# Altium footprint library SG__PCB_HOLE_Connector.PcbLib: 174 footprints (part 6 of 11)
Each footprint in its own frame and in the unit in brackets; x right, y up, seen from the top. Pads: shape width x height; smd on the part's side, far side on the other; paste and mask are expansions set on the pad; w line width, h text height; cw(c..) or ccw(c..) is an arc to the next point about the centre after c.
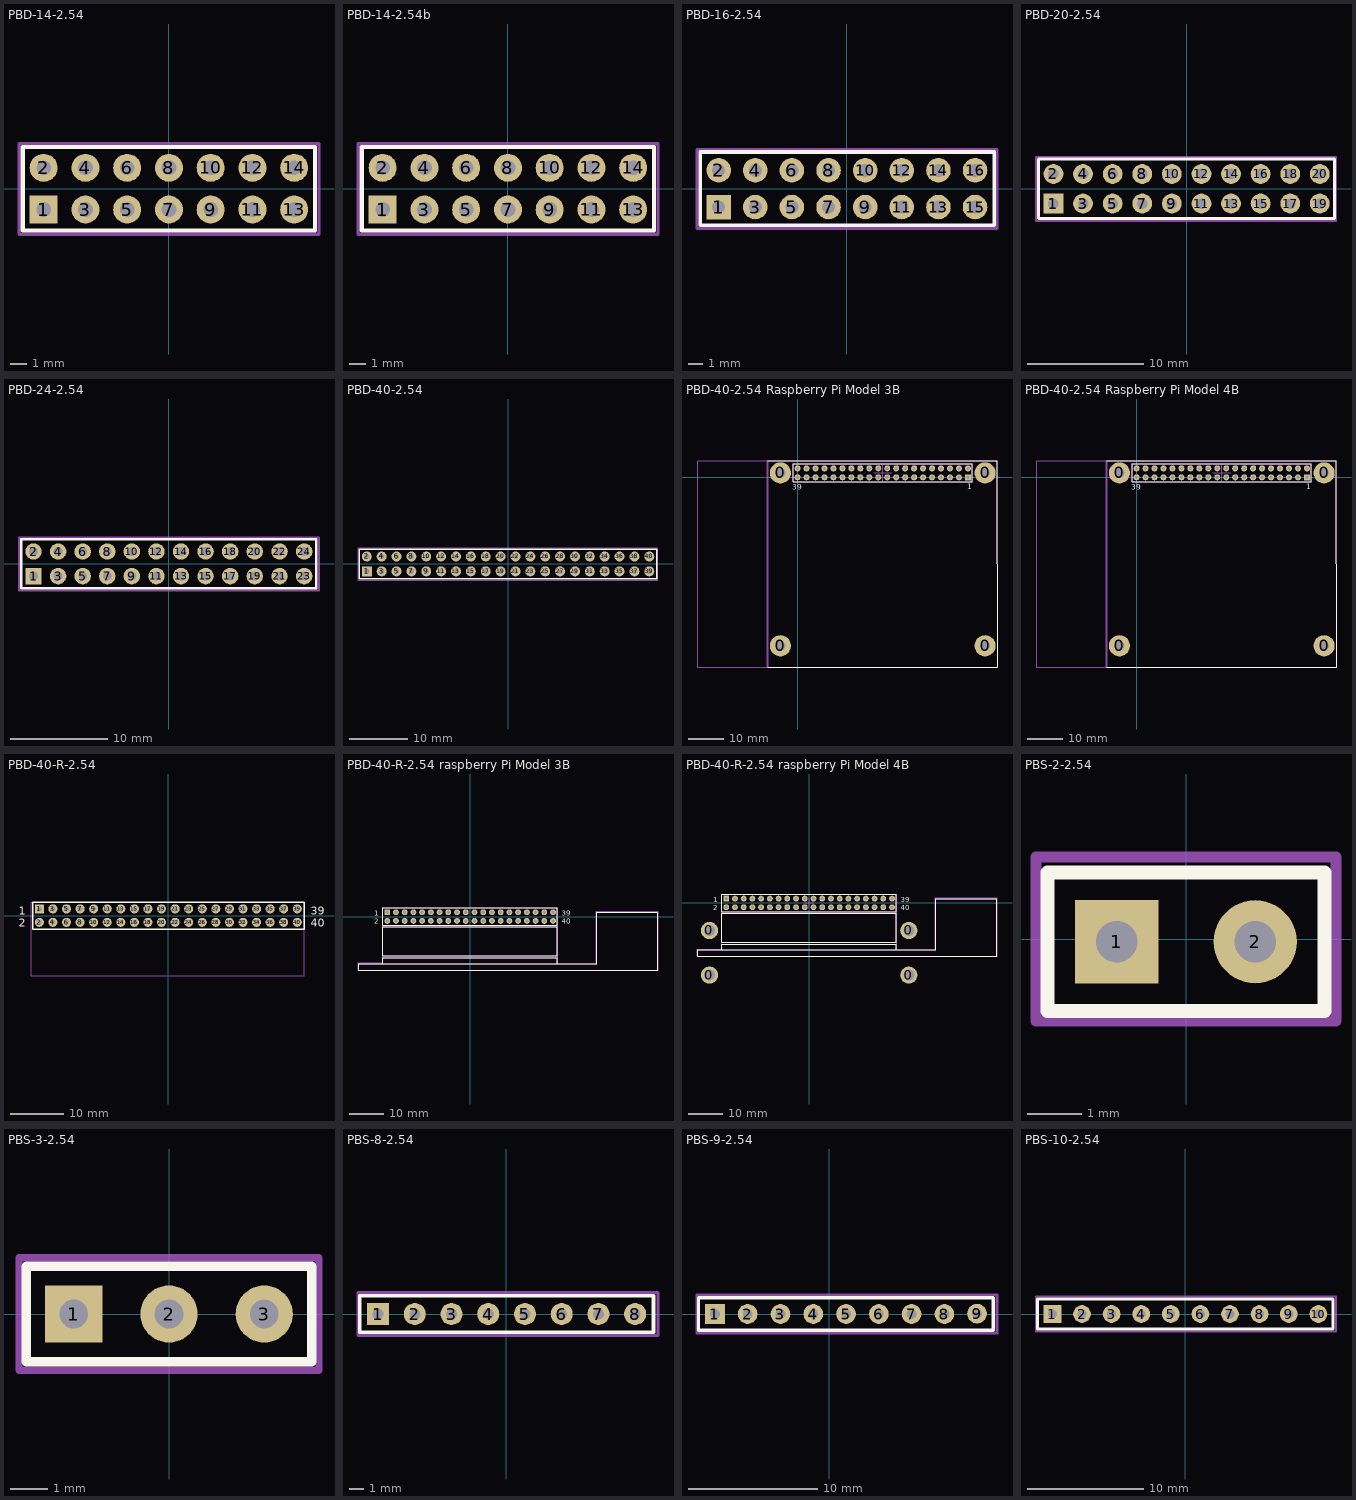
[diagram p5: the footprints below, top view; thin cyan lines are the x and y axes]

## PBD-14-2.54 [mm]
pads (14):
  rect 1.7x1.7 hole 0.9: 1(-7.62,-1.27)
  round 1.7 hole 0.9: 2(-7.62,1.27) 3(-5.08,-1.27) 4(-5.08,1.27) 5(-2.54,-1.27) 6(-2.54,1.27) 7(0,-1.27) 8(0,1.27) 9(2.54,-1.27) 10(2.54,1.27) 11(5.08,-1.27) 12(5.08,1.27) 13(7.62,-1.27) 14(7.62,1.27)
Top Overlay:
  lines w0.254: -8.89,-2.54 -8.89,2.54 8.89,2.54 8.89,-2.54 -8.89,-2.54
Top Courtyard:
  lines w0.2: -9.12,-2.77 -9.12,2.73 9.13,2.73 9.13,-2.77 -9.12,-2.77
3D body "PBS1-2.54.stp": height 9, standoff -2.65, extent 6.35,0 8.89,2.54
3D body "PBS1-2.54.stp": height 9, standoff -2.65, extent 6.35,-2.54 8.89,0
3D body "PBS1-2.54.stp": height 9, standoff -2.65, extent 1.27,0 3.81,2.54
3D body "PBS1-2.54.stp": height 9, standoff -2.65, extent 1.27,-2.54 3.81,0
3D body "PBS1-2.54.stp": height 9, standoff -2.65, extent 3.81,-2.54 6.35,0
3D body "PBS1-2.54.stp": height 9, standoff -2.65, extent 3.81,0 6.35,2.54
3D body "PBS1-2.54.stp": height 9, standoff -2.65, extent -3.81,0 -1.27,2.54
3D body "PBS1-2.54.stp": height 9, standoff -2.65, extent -3.81,-2.54 -1.27,0
3D body "PBS1-2.54.stp": height 9, standoff -2.65, extent -1.27,-2.54 1.27,0
3D body "PBS1-2.54.stp": height 9, standoff -2.65, extent -1.27,0 1.27,2.54
3D body "PBS1-2.54.stp": height 9, standoff -2.65, extent -6.35,0 -3.81,2.54
3D body "PBS1-2.54.stp": height 9, standoff -2.65, extent -6.35,-2.54 -3.81,0
3D body "PBS1-2.54.stp": height 9, standoff -2.65, extent -8.89,-2.54 -6.35,0
3D body "PBS1-2.54.stp": height 9, standoff -2.65, extent -8.89,0 -6.35,2.54

## PBD-14-2.54b [mm]
pads (14):
  rect 1.7x1.7 hole 0.9: 1(-7.62,-1.27)
  round 1.7 hole 0.9: 2(-7.62,1.27) 3(-5.08,-1.27) 4(-5.08,1.27) 5(-2.54,-1.27) 6(-2.54,1.27) 7(0,-1.27) 8(0,1.27) 9(2.54,-1.27) 10(2.54,1.27) 11(5.08,-1.27) 12(5.08,1.27) 13(7.62,-1.27) 14(7.62,1.27)
Top Overlay:
  lines w0.254: -8.89,-2.54 8.89,-2.54 8.89,2.54 -8.89,2.54 -8.89,-2.54
Top Courtyard:
  lines w0.2: -9.12,-2.77 -9.12,2.73 9.13,2.73 9.13,-2.77 -9.12,-2.77
3D body "PBS1-2.54.stp": height 2.65, standoff -9, extent -8.89,0 -6.35,2.54
3D body "PBS1-2.54.stp": height 2.65, standoff -9, extent -8.89,-2.54 -6.35,0
3D body "PBS1-2.54.stp": height 2.65, standoff -9, extent -6.35,-2.54 -3.81,0
3D body "PBS1-2.54.stp": height 2.65, standoff -9, extent -6.35,0 -3.81,2.54
3D body "PBS1-2.54.stp": height 2.65, standoff -9, extent -1.27,0 1.27,2.54
3D body "PBS1-2.54.stp": height 2.65, standoff -9, extent -1.27,-2.54 1.27,0
3D body "PBS1-2.54.stp": height 2.65, standoff -9, extent -3.81,-2.54 -1.27,0
3D body "PBS1-2.54.stp": height 2.65, standoff -9, extent -3.81,0 -1.27,2.54
3D body "PBS1-2.54.stp": height 2.65, standoff -9, extent 3.81,0 6.35,2.54
3D body "PBS1-2.54.stp": height 2.65, standoff -9, extent 3.81,-2.54 6.35,0
3D body "PBS1-2.54.stp": height 2.65, standoff -9, extent 1.27,-2.54 3.81,0
3D body "PBS1-2.54.stp": height 2.65, standoff -9, extent 1.27,0 3.81,2.54
3D body "PBS1-2.54.stp": height 2.65, standoff -9, extent 6.35,-2.54 8.89,0
3D body "PBS1-2.54.stp": height 2.65, standoff -9, extent 6.35,0 8.89,2.54

## PBD-16-2.54 [mm]
pads (16):
  rect 1.7x1.7 hole 0.9: 1(-8.89,-1.27)
  round 1.7 hole 0.9: 2(-8.89,1.27) 3(-6.35,-1.27) 4(-6.35,1.27) 5(-3.81,-1.27) 6(-3.81,1.27) 7(-1.27,-1.27) 8(-1.27,1.27) 9(1.27,-1.27) 10(1.27,1.27) 11(3.81,-1.27) 12(3.81,1.27) 13(6.35,-1.27) 14(6.35,1.27) 15(8.89,-1.27) 16(8.89,1.27)
Top Overlay:
  lines w0.254: -10.16,-2.54 10.21,-2.54 10.21,2.54 -10.16,2.54 -10.16,-2.54
Top Courtyard:
  lines w0.2: -10.39,-2.77 -10.39,2.73 10.41,2.73 10.41,-2.77 -10.39,-2.77
3D body "PBS1-2.54.stp": height 9, standoff -2.65, extent -10.16,0 -7.62,2.54
3D body "PBS1-2.54.stp": height 9, standoff -2.65, extent -10.16,-2.54 -7.62,0
3D body "PBS1-2.54.stp": height 9, standoff -2.65, extent -7.62,-2.54 -5.08,0
3D body "PBS1-2.54.stp": height 9, standoff -2.65, extent -7.62,0 -5.08,2.54
3D body "PBS1-2.54.stp": height 9, standoff -2.65, extent -2.54,0 0,2.54
3D body "PBS1-2.54.stp": height 9, standoff -2.65, extent -2.54,-2.54 0,0
3D body "PBS1-2.54.stp": height 9, standoff -2.65, extent -5.08,-2.54 -2.54,0
3D body "PBS1-2.54.stp": height 9, standoff -2.65, extent -5.08,0 -2.54,2.54
3D body "PBS1-2.54.stp": height 9, standoff -2.65, extent 2.54,0 5.08,2.54
3D body "PBS1-2.54.stp": height 9, standoff -2.65, extent 2.54,-2.54 5.08,0
3D body "PBS1-2.54.stp": height 9, standoff -2.65, extent 0,-2.54 2.54,0
3D body "PBS1-2.54.stp": height 9, standoff -2.65, extent 0,0 2.54,2.54
3D body "PBS1-2.54.stp": height 9, standoff -2.65, extent 7.62,0 10.16,2.54
3D body "PBS1-2.54.stp": height 9, standoff -2.65, extent 7.62,-2.54 10.16,0
3D body "PBS1-2.54.stp": height 9, standoff -2.65, extent 5.08,-2.54 7.62,0
3D body "PBS1-2.54.stp": height 9, standoff -2.65, extent 5.08,0 7.62,2.54

## PBD-20-2.54 [mm]
pads (20):
  rect 1.7x1.7 hole 0.9: 1(-11.43,-1.27)
  round 1.7 hole 0.9: 2(-11.43,1.27) 3(-8.89,-1.27) 4(-8.89,1.27) 5(-6.35,-1.27) 6(-6.35,1.27) 7(-3.81,-1.27) 8(-3.81,1.27) 9(-1.27,-1.27) 10(-1.27,1.27) 11(1.27,-1.27) 12(1.27,1.27) 13(3.81,-1.27) 14(3.81,1.27) 15(6.35,-1.27) 16(6.35,1.27) 17(8.89,-1.27) 18(8.89,1.27) 19(11.43,-1.27) 20(11.43,1.27)
Top Overlay:
  lines w0.254: -12.7,-2.54 12.7,-2.54 12.7,2.54 -12.7,2.54 -12.7,-2.54
Top Courtyard:
  lines w0.2: -12.93,-2.77 -12.93,2.73 12.82,2.73 12.82,-2.77 -12.93,-2.77
3D body "PBS1-2.54.stp": height 9, standoff -2.65, extent -12.7,0 -10.16,2.54
3D body "PBS1-2.54.stp": height 9, standoff -2.65, extent -12.7,-2.54 -10.16,0
3D body "PBS1-2.54.stp": height 9, standoff -2.65, extent -10.16,-2.54 -7.62,0
3D body "PBS1-2.54.stp": height 9, standoff -2.65, extent -10.16,0 -7.62,2.54
3D body "PBS1-2.54.stp": height 9, standoff -2.65, extent -5.08,0 -2.54,2.54
3D body "PBS1-2.54.stp": height 9, standoff -2.65, extent -5.08,-2.54 -2.54,0
3D body "PBS1-2.54.stp": height 9, standoff -2.65, extent -7.62,-2.54 -5.08,0
3D body "PBS1-2.54.stp": height 9, standoff -2.65, extent -7.62,0 -5.08,2.54
3D body "PBS1-2.54.stp": height 9, standoff -2.65, extent 0,0 2.54,2.54
3D body "PBS1-2.54.stp": height 9, standoff -2.65, extent 0,-2.54 2.54,0
3D body "PBS1-2.54.stp": height 9, standoff -2.65, extent -2.54,-2.54 0,0
3D body "PBS1-2.54.stp": height 9, standoff -2.65, extent -2.54,0 0,2.54
3D body "PBS1-2.54.stp": height 9, standoff -2.65, extent 5.08,0 7.62,2.54
3D body "PBS1-2.54.stp": height 9, standoff -2.65, extent 5.08,-2.54 7.62,0
3D body "PBS1-2.54.stp": height 9, standoff -2.65, extent 2.54,-2.54 5.08,0
3D body "PBS1-2.54.stp": height 9, standoff -2.65, extent 2.54,0 5.08,2.54
3D body "PBS1-2.54.stp": height 9, standoff -2.65, extent 10.16,0 12.7,2.54
3D body "PBS1-2.54.stp": height 9, standoff -2.65, extent 10.16,-2.54 12.7,0
3D body "PBS1-2.54.stp": height 9, standoff -2.65, extent 7.62,-2.54 10.16,0
3D body "PBS1-2.54.stp": height 9, standoff -2.65, extent 7.62,0 10.16,2.54

## PBD-24-2.54 [mm]
pads (24):
  rect 1.7x1.7 hole 0.9: 1(-13.983,-1.27)
  round 1.7 hole 0.9: 2(-13.983,1.27) 3(-11.443,-1.27) 4(-11.443,1.27) 5(-8.903,-1.27) 6(-8.903,1.27) 7(-6.363,-1.27) 8(-6.363,1.27) 9(-3.823,-1.27) 10(-3.823,1.27) 11(-1.283,-1.27) 12(-1.283,1.27) 13(1.257,-1.27) 14(1.257,1.27) 15(3.797,-1.27) 16(3.797,1.27) 17(6.337,-1.27) 18(6.337,1.27) 19(8.877,-1.27) 20(8.877,1.27) 21(11.443,-1.27) 22(11.443,1.27) 23(13.983,-1.27) 24(13.983,1.27)
Top Overlay:
  lines w0.254: -15.253,-2.54 15.253,-2.54 15.253,2.54 -15.253,2.54 -15.253,-2.54
Top Courtyard:
  lines w0.2: -15.483,-2.77 -15.483,2.73 15.517,2.73 15.517,-2.77 -15.483,-2.77
3D body "PBS1-2.54.stp": height 9, standoff -2.65, extent 5.067,-2.54 7.607,0
3D body "PBS1-2.54.stp": height 9, standoff -2.65, extent 5.067,0 7.607,2.54
3D body "PBS1-2.54.stp": height 9, standoff -2.65, extent 10.147,0 12.687,2.54
3D body "PBS1-2.54.stp": height 9, standoff -2.65, extent 10.147,-2.54 12.687,0
3D body "PBS1-2.54.stp": height 9, standoff -2.65, extent 12.687,-2.54 15.227,0
3D body "PBS1-2.54.stp": height 9, standoff -2.65, extent 12.687,0 15.227,2.54
3D body "PBS1-2.54.stp": height 9, standoff -2.65, extent -15.253,0 -12.713,2.54
3D body "PBS1-2.54.stp": height 9, standoff -2.65, extent -15.253,-2.54 -12.713,0
3D body "PBS1-2.54.stp": height 9, standoff -2.65, extent -12.713,-2.54 -10.173,0
3D body "PBS1-2.54.stp": height 9, standoff -2.65, extent -12.713,0 -10.173,2.54
3D body "PBS1-2.54.stp": height 9, standoff -2.65, extent -7.633,0 -5.093,2.54
3D body "PBS1-2.54.stp": height 9, standoff -2.65, extent -7.633,-2.54 -5.093,0
3D body "PBS1-2.54.stp": height 9, standoff -2.65, extent -10.173,-2.54 -7.633,0
3D body "PBS1-2.54.stp": height 9, standoff -2.65, extent -10.173,0 -7.633,2.54
3D body "PBS1-2.54.stp": height 9, standoff -2.65, extent -2.553,0 -0.013,2.54
3D body "PBS1-2.54.stp": height 9, standoff -2.65, extent -2.553,-2.54 -0.013,0
3D body "PBS1-2.54.stp": height 9, standoff -2.65, extent -5.093,-2.54 -2.553,0
3D body "PBS1-2.54.stp": height 9, standoff -2.65, extent -5.093,0 -2.553,2.54
3D body "PBS1-2.54.stp": height 9, standoff -2.65, extent 2.527,0 5.067,2.54
3D body "PBS1-2.54.stp": height 9, standoff -2.65, extent 2.527,-2.54 5.067,0
3D body "PBS1-2.54.stp": height 9, standoff -2.65, extent -0.013,-2.54 2.527,0
3D body "PBS1-2.54.stp": height 9, standoff -2.65, extent -0.013,0 2.527,2.54
3D body "PBS1-2.54.stp": height 9, standoff -2.65, extent 7.607,0 10.147,2.54
3D body "PBS1-2.54.stp": height 9, standoff -2.65, extent 7.607,-2.54 10.147,0

## PBD-40-2.54 [mm]
pads (40):
  rect 1.7x1.7 hole 0.9: 1(-24.13,-1.27)
  round 1.7 hole 0.9: 2(-24.13,1.27) 3(-21.59,-1.27) 4(-21.59,1.27) 5(-19.05,-1.27) 6(-19.05,1.27) 7(-16.51,-1.27) 8(-16.51,1.27) 9(-13.97,-1.27) 10(-13.97,1.27) 11(-11.43,-1.27) 12(-11.43,1.27) 13(-8.89,-1.27) 14(-8.89,1.27) 15(-6.35,-1.27) 16(-6.35,1.27) 17(-3.81,-1.27) 18(-3.81,1.27) 19(-1.27,-1.27) 20(-1.27,1.27) 21(1.27,-1.27) 22(1.27,1.27) 23(3.81,-1.27) 24(3.81,1.27) 25(6.35,-1.27) 26(6.35,1.27) 27(8.89,-1.27) 28(8.89,1.27) 29(11.43,-1.27) 30(11.43,1.27) 31(13.97,-1.27) 32(13.97,1.27) 33(16.51,-1.27) 34(16.51,1.27) 35(19.05,-1.27) 36(19.05,1.27) 37(21.59,-1.27) 38(21.59,1.27) 39(24.13,-1.27) 40(24.13,1.27)
Top Overlay:
  lines w0.254: -25.4,-2.54 -25.4,2.54 0,2.54 25.4,2.54 25.4,-2.54 0,-2.54 -25.4,-2.54
Top Courtyard:
  lines w0.2: -25.63,-2.77 25.62,-2.77 25.62,2.73 -25.63,2.73 -25.63,-2.77
3D body "PBS1-2.54.stp": height 9, standoff -2.65, extent -15.24,-2.54 -12.7,0
3D body "PBS1-2.54.stp": height 9, standoff -2.65, extent -12.7,-2.54 -10.16,0
3D body "PBS1-2.54.stp": height 9, standoff -2.65, extent -12.7,0 -10.16,2.54
3D body "PBS1-2.54.stp": height 9, standoff -2.65, extent -20.32,0 -17.78,2.54
3D body "PBS1-2.54.stp": height 9, standoff -2.65, extent -20.32,-2.54 -17.78,0
3D body "PBS1-2.54.stp": height 9, standoff -2.65, extent -17.78,-2.54 -15.24,0
3D body "PBS1-2.54.stp": height 9, standoff -2.65, extent -17.78,0 -15.24,2.54
3D body "PBS1-2.54.stp": height 9, standoff -2.65, extent -22.86,0 -20.32,2.54
3D body "PBS1-2.54.stp": height 9, standoff -2.65, extent -22.86,-2.54 -20.32,0
3D body "PBS1-2.54.stp": height 9, standoff -2.65, extent -25.4,-2.54 -22.86,0
3D body "PBS1-2.54.stp": height 9, standoff -2.65, extent -25.4,0 -22.86,2.54
3D body "PBS1-2.54.stp": height 9, standoff -2.65, extent 0,0 2.54,2.54
3D body "PBS1-2.54.stp": height 9, standoff -2.65, extent 0,-2.54 2.54,0
3D body "PBS1-2.54.stp": height 9, standoff -2.65, extent 2.54,-2.54 5.08,0
3D body "PBS1-2.54.stp": height 9, standoff -2.65, extent 2.54,0 5.08,2.54
3D body "PBS1-2.54.stp": height 9, standoff -2.65, extent 7.62,0 10.16,2.54
3D body "PBS1-2.54.stp": height 9, standoff -2.65, extent 7.62,-2.54 10.16,0
3D body "PBS1-2.54.stp": height 9, standoff -2.65, extent 5.08,-2.54 7.62,0
3D body "PBS1-2.54.stp": height 9, standoff -2.65, extent 5.08,0 7.62,2.54
3D body "PBS1-2.54.stp": height 9, standoff -2.65, extent 12.7,0 15.24,2.54
3D body "PBS1-2.54.stp": height 9, standoff -2.65, extent 12.7,-2.54 15.24,0
3D body "PBS1-2.54.stp": height 9, standoff -2.65, extent 10.16,-2.54 12.7,0
3D body "PBS1-2.54.stp": height 9, standoff -2.65, extent 10.16,0 12.7,2.54
3D body "PBS1-2.54.stp": height 9, standoff -2.65, extent 17.78,0 20.32,2.54
3D body "PBS1-2.54.stp": height 9, standoff -2.65, extent 17.78,-2.54 20.32,0
3D body "PBS1-2.54.stp": height 9, standoff -2.65, extent 15.24,-2.54 17.78,0
3D body "PBS1-2.54.stp": height 9, standoff -2.65, extent 15.24,0 17.78,2.54
3D body "PBS1-2.54.stp": height 9, standoff -2.65, extent 22.86,0 25.4,2.54
3D body "PBS1-2.54.stp": height 9, standoff -2.65, extent 22.86,-2.54 25.4,0
3D body "PBS1-2.54.stp": height 9, standoff -2.65, extent 20.32,-2.54 22.86,0
3D body "PBS1-2.54.stp": height 9, standoff -2.65, extent 20.32,0 22.86,2.54
3D body "PBS1-2.54.stp": height 9, standoff -2.65, extent -5.08,0 -2.54,2.54
3D body "PBS1-2.54.stp": height 9, standoff -2.65, extent -5.08,-2.54 -2.54,0
3D body "PBS1-2.54.stp": height 9, standoff -2.65, extent -2.54,-2.54 0,0
3D body "PBS1-2.54.stp": height 9, standoff -2.65, extent -2.54,0 0,2.54
3D body "PBS1-2.54.stp": height 9, standoff -2.65, extent -10.16,0 -7.62,2.54
3D body "PBS1-2.54.stp": height 9, standoff -2.65, extent -10.16,-2.54 -7.62,0
3D body "PBS1-2.54.stp": height 9, standoff -2.65, extent -7.62,-2.54 -5.08,0
3D body "PBS1-2.54.stp": height 9, standoff -2.65, extent -7.62,0 -5.08,2.54
3D body "PBS1-2.54.stp": height 9, standoff -2.65, extent -15.24,0 -12.7,2.54

## PBD-40-2.54 Raspberry Pi Model 3B [mm]
pads (44):
  round 6 hole 2.75: 0(-4.87,-47.73) 0(-4.87,1.27) 0(53.13,-47.73) 0(53.13,1.27)
  rect 1.7x1.7 hole 0.9: 1(48.26,0)
  round 1.7 hole 0.9: 2(48.26,2.54) 3(45.72,0) 4(45.72,2.54) 5(43.18,0) 6(43.18,2.54) 7(40.64,0) 8(40.64,2.54) 9(38.1,0) 10(38.1,2.54) 11(35.56,0) 12(35.56,2.54) 13(33.02,0) 14(33.02,2.54) 15(30.48,0) 16(30.48,2.54) 17(27.94,0) 18(27.94,2.54) 19(25.4,0) 20(25.4,2.54) 21(22.86,0) 22(22.86,2.54) 23(20.32,0) 24(20.32,2.54) 25(17.78,0) 26(17.78,2.54) 27(15.24,0) 28(15.24,2.54) 29(12.7,0) 30(12.7,2.54) 31(10.16,0) 32(10.16,2.54) 33(7.62,0) 34(7.62,2.54) 35(5.08,0) 36(5.08,2.54) 37(2.54,0) 38(2.54,2.54) 39(0,0) 40(0,2.54)
Top Overlay:
  lines w0.2: -8.5,-53.8 56.5,-53.8 56.5,4.7 -8.5,4.7
  lines w0.254: -1.27,-1.27 24.13,-1.27 49.53,-1.27 49.53,3.81 24.13,3.81 -1.27,3.81 -1.27,-1.27
  text "39" at -1.476,-3.503 h1.52
  text "1" at 48.057,-3.428 h1.52
Top Assembly:
  lines w0.2: -28.5,-53.8 56.5,-53.8 56.5,4.7 -28.5,4.7 -28.5,-53.766
  lines w0.254: -1.27,-1.27 -1.27,3.81 24.13,3.81 49.53,3.81 49.53,-1.27 24.13,-1.27 -1.27,-1.27
Dimensions:
  lines w0.2: 21.59,1.27 26.67,1.27 ; 24.13,-1.27 24.13,3.81
  lines w0.5: -8.5,-53.8 -8.5,4.7
  text "Board edge" at -9.762,-32.246 h1.52
Top Courtyard:
  lines w0.2: -28.5,-53.811 -28.5,4.689 ; -28.5,-53.8 56.5,-53.8 56.5,4.7 -28.5,4.7
3D body "raspberryPi3BSimplified_STEP.STEP": height 15, standoff -3.55, extent -30.3,-53.8 56.7,4.7
3D body "PBS1-2.54.stp": height 9, standoff -2.65, extent 8.89,1.27 11.43,3.81
3D body "PBS1-2.54.stp": height 9, standoff -2.65, extent -1.27,-1.27 1.27,1.27
3D body "PBS1-2.54.stp": height 9, standoff -2.65, extent -1.27,1.27 1.27,3.81
3D body "PBS1-2.54.stp": height 9, standoff -2.65, extent 3.81,1.27 6.35,3.81
3D body "PBS1-2.54.stp": height 9, standoff -2.65, extent 3.81,-1.27 6.35,1.27
3D body "PBS1-2.54.stp": height 9, standoff -2.65, extent 6.35,-1.27 8.89,1.27
3D body "PBS1-2.54.stp": height 9, standoff -2.65, extent 6.35,1.27 8.89,3.81
3D body "PBS1-2.54.stp": height 9, standoff -2.65, extent 1.27,1.27 3.81,3.81
3D body "PBS1-2.54.stp": height 9, standoff -2.65, extent 1.27,-1.27 3.81,1.27
3D body "PBS1-2.54.stp": height 9, standoff -2.65, extent 8.89,-1.27 11.43,1.27
3D body "PBS1-2.54.stp": height 9, standoff -2.65, extent 11.43,-1.27 13.97,1.27
3D body "PBS1-2.54.stp": height 9, standoff -2.65, extent 11.43,1.27 13.97,3.81
3D body "PBS1-2.54.stp": height 9, standoff -2.65, extent 13.97,1.27 16.51,3.81
3D body "PBS1-2.54.stp": height 9, standoff -2.65, extent 13.97,-1.27 16.51,1.27
3D body "PBS1-2.54.stp": height 9, standoff -2.65, extent 16.51,-1.27 19.05,1.27
3D body "PBS1-2.54.stp": height 9, standoff -2.65, extent 16.51,1.27 19.05,3.81
3D body "PBS1-2.54.stp": height 9, standoff -2.65, extent 19.05,1.27 21.59,3.81
3D body "PBS1-2.54.stp": height 9, standoff -2.65, extent 19.05,-1.27 21.59,1.27
3D body "PBS1-2.54.stp": height 9, standoff -2.65, extent 21.59,-1.27 24.13,1.27
3D body "PBS1-2.54.stp": height 9, standoff -2.65, extent 21.59,1.27 24.13,3.81
3D body "PBS1-2.54.stp": height 9, standoff -2.65, extent 24.13,1.27 26.67,3.81
3D body "PBS1-2.54.stp": height 9, standoff -2.65, extent 24.13,-1.27 26.67,1.27
3D body "PBS1-2.54.stp": height 9, standoff -2.65, extent 26.67,-1.27 29.21,1.27
3D body "PBS1-2.54.stp": height 9, standoff -2.65, extent 26.67,1.27 29.21,3.81
3D body "PBS1-2.54.stp": height 9, standoff -2.65, extent 29.21,1.27 31.75,3.81
3D body "PBS1-2.54.stp": height 9, standoff -2.65, extent 29.21,-1.27 31.75,1.27
3D body "PBS1-2.54.stp": height 9, standoff -2.65, extent 31.75,1.27 34.29,3.81
3D body "PBS1-2.54.stp": height 9, standoff -2.65, extent 31.75,-1.27 34.29,1.27
3D body "PBS1-2.54.stp": height 9, standoff -2.65, extent 34.29,1.27 36.83,3.81
3D body "PBS1-2.54.stp": height 9, standoff -2.65, extent 34.29,-1.27 36.83,1.27
3D body "PBS1-2.54.stp": height 9, standoff -2.65, extent 36.83,1.27 39.37,3.81
3D body "PBS1-2.54.stp": height 9, standoff -2.65, extent 36.83,-1.27 39.37,1.27
3D body "PBS1-2.54.stp": height 9, standoff -2.65, extent 39.37,1.27 41.91,3.81
3D body "PBS1-2.54.stp": height 9, standoff -2.65, extent 39.37,-1.27 41.91,1.27
3D body "PBS1-2.54.stp": height 9, standoff -2.65, extent 41.91,1.27 44.45,3.81
3D body "PBS1-2.54.stp": height 9, standoff -2.65, extent 41.91,-1.27 44.45,1.27
3D body "PBS1-2.54.stp": height 9, standoff -2.65, extent 44.45,1.27 46.99,3.81
3D body "PBS1-2.54.stp": height 9, standoff -2.65, extent 44.45,-1.27 46.99,1.27
3D body "PBS1-2.54.stp": height 9, standoff -2.65, extent 46.99,1.27 49.53,3.81
3D body "PBS1-2.54.stp": height 9, standoff -2.65, extent 46.99,-1.27 49.53,1.27

## PBD-40-2.54 Raspberry Pi Model 4B [mm]
pads (44):
  round 6 hole 2.75: 0(-4.87,-47.73) 0(-4.87,1.27) 0(53.13,-47.73) 0(53.13,1.27)
  rect 1.7x1.7 hole 0.9: 1(48.26,0)
  round 1.7 hole 0.9: 2(48.26,2.54) 3(45.72,0) 4(45.72,2.54) 5(43.18,0) 6(43.18,2.54) 7(40.64,0) 8(40.64,2.54) 9(38.1,0) 10(38.1,2.54) 11(35.56,0) 12(35.56,2.54) 13(33.02,0) 14(33.02,2.54) 15(30.48,0) 16(30.48,2.54) 17(27.94,0) 18(27.94,2.54) 19(25.4,0) 20(25.4,2.54) 21(22.86,0) 22(22.86,2.54) 23(20.32,0) 24(20.32,2.54) 25(17.78,0) 26(17.78,2.54) 27(15.24,0) 28(15.24,2.54) 29(12.7,0) 30(12.7,2.54) 31(10.16,0) 32(10.16,2.54) 33(7.62,0) 34(7.62,2.54) 35(5.08,0) 36(5.08,2.54) 37(2.54,0) 38(2.54,2.54) 39(0,0) 40(0,2.54)
Top Overlay:
  lines w0.2: -8.5,-53.8 56.5,-53.8 56.5,4.7 -8.5,4.7
  lines w0.254: -1.27,-1.27 24.13,-1.27 49.53,-1.27 49.53,3.81 24.13,3.81 -1.27,3.81 -1.27,-1.27
  text "39" at -1.476,-3.503 h1.52
  text "1" at 48.057,-3.428 h1.52
Top Assembly:
  lines w0.2: -28.5,-53.8 56.5,-53.8 56.5,4.7 -28.5,4.7 -28.5,-53.766
  lines w0.254: -1.27,-1.27 -1.27,3.81 24.13,3.81 49.53,3.81 49.53,-1.27 24.13,-1.27 -1.27,-1.27
Dimensions:
  lines w0.2: 21.59,1.27 26.67,1.27 ; 24.13,-1.27 24.13,3.81
  lines w0.5: -8.5,-53.8 -8.5,4.7
  text "Board edge" at -9.762,-32.246 h1.52
Top Courtyard:
  lines w0.2: -28.5,-53.811 -28.5,4.689 ; -28.5,-53.8 56.5,-53.8 56.5,4.7 -28.5,4.7
3D body "PBS1-2.54.stp": height 9, standoff -2.65, extent 8.89,1.27 11.43,3.81
3D body "PBS1-2.54.stp": height 9, standoff -2.65, extent -1.27,-1.27 1.27,1.27
3D body "PBS1-2.54.stp": height 9, standoff -2.65, extent -1.27,1.27 1.27,3.81
3D body "PBS1-2.54.stp": height 9, standoff -2.65, extent 3.81,1.27 6.35,3.81
3D body "PBS1-2.54.stp": height 9, standoff -2.65, extent 3.81,-1.27 6.35,1.27
3D body "PBS1-2.54.stp": height 9, standoff -2.65, extent 6.35,-1.27 8.89,1.27
3D body "PBS1-2.54.stp": height 9, standoff -2.65, extent 6.35,1.27 8.89,3.81
3D body "PBS1-2.54.stp": height 9, standoff -2.65, extent 1.27,1.27 3.81,3.81
3D body "PBS1-2.54.stp": height 9, standoff -2.65, extent 1.27,-1.27 3.81,1.27
3D body "PBS1-2.54.stp": height 9, standoff -2.65, extent 8.89,-1.27 11.43,1.27
3D body "PBS1-2.54.stp": height 9, standoff -2.65, extent 11.43,-1.27 13.97,1.27
3D body "PBS1-2.54.stp": height 9, standoff -2.65, extent 11.43,1.27 13.97,3.81
3D body "PBS1-2.54.stp": height 9, standoff -2.65, extent 13.97,1.27 16.51,3.81
3D body "PBS1-2.54.stp": height 9, standoff -2.65, extent 13.97,-1.27 16.51,1.27
3D body "PBS1-2.54.stp": height 9, standoff -2.65, extent 16.51,-1.27 19.05,1.27
3D body "PBS1-2.54.stp": height 9, standoff -2.65, extent 16.51,1.27 19.05,3.81
3D body "PBS1-2.54.stp": height 9, standoff -2.65, extent 19.05,1.27 21.59,3.81
3D body "PBS1-2.54.stp": height 9, standoff -2.65, extent 19.05,-1.27 21.59,1.27
3D body "PBS1-2.54.stp": height 9, standoff -2.65, extent 21.59,-1.27 24.13,1.27
3D body "PBS1-2.54.stp": height 9, standoff -2.65, extent 21.59,1.27 24.13,3.81
3D body "PBS1-2.54.stp": height 9, standoff -2.65, extent 24.13,1.27 26.67,3.81
3D body "PBS1-2.54.stp": height 9, standoff -2.65, extent 24.13,-1.27 26.67,1.27
3D body "PBS1-2.54.stp": height 9, standoff -2.65, extent 26.67,-1.27 29.21,1.27
3D body "PBS1-2.54.stp": height 9, standoff -2.65, extent 26.67,1.27 29.21,3.81
3D body "PBS1-2.54.stp": height 9, standoff -2.65, extent 29.21,1.27 31.75,3.81
3D body "PBS1-2.54.stp": height 9, standoff -2.65, extent 29.21,-1.27 31.75,1.27
3D body "PBS1-2.54.stp": height 9, standoff -2.65, extent 31.75,1.27 34.29,3.81
3D body "PBS1-2.54.stp": height 9, standoff -2.65, extent 31.75,-1.27 34.29,1.27
3D body "PBS1-2.54.stp": height 9, standoff -2.65, extent 34.29,1.27 36.83,3.81
3D body "PBS1-2.54.stp": height 9, standoff -2.65, extent 34.29,-1.27 36.83,1.27
3D body "PBS1-2.54.stp": height 9, standoff -2.65, extent 36.83,1.27 39.37,3.81
3D body "PBS1-2.54.stp": height 9, standoff -2.65, extent 36.83,-1.27 39.37,1.27
3D body "PBS1-2.54.stp": height 9, standoff -2.65, extent 39.37,1.27 41.91,3.81
3D body "PBS1-2.54.stp": height 9, standoff -2.65, extent 39.37,-1.27 41.91,1.27
3D body "PBS1-2.54.stp": height 9, standoff -2.65, extent 41.91,1.27 44.45,3.81
3D body "PBS1-2.54.stp": height 9, standoff -2.65, extent 41.91,-1.27 44.45,1.27
3D body "PBS1-2.54.stp": height 9, standoff -2.65, extent 44.45,1.27 46.99,3.81
3D body "PBS1-2.54.stp": height 9, standoff -2.65, extent 44.45,-1.27 46.99,1.27
3D body "PBS1-2.54.stp": height 9, standoff -2.65, extent 46.99,1.27 49.53,3.81
3D body "PBS1-2.54.stp": height 9, standoff -2.65, extent 46.99,-1.27 49.53,1.27
3D body "Raspberry Pi 4 Model B.STEP": height 15.4, standoff -4.5, extent -32.09,-53.6 56.9,4.8

## PBD-40-R-2.54 [mm]
pads (40):
  rect 1.7x1.7 hole 0.9: 1(-24.13,1.255)
  round 1.7 hole 0.9: 2(-24.13,-1.255) 3(-21.59,1.255) 4(-21.59,-1.255) 5(-19.05,1.255) 6(-19.05,-1.255) 7(-16.51,1.255) 8(-16.51,-1.255) 9(-13.97,1.255) 10(-13.97,-1.255) 11(-11.43,1.255) 12(-11.43,-1.255) 13(-8.89,1.255) 14(-8.89,-1.255) 15(-6.35,1.255) 16(-6.35,-1.255) 17(-3.81,1.255) 18(-3.81,-1.255) 19(-1.27,1.255) 20(-1.27,-1.255) 21(1.27,1.255) 22(1.27,-1.255) 23(3.81,1.255) 24(3.81,-1.255) 25(6.35,1.255) 26(6.35,-1.255) 27(8.89,1.255) 28(8.89,-1.255) 29(11.43,1.255) 30(11.43,-1.255) 31(13.97,1.255) 32(13.97,-1.255) 33(16.51,1.255) 34(16.51,-1.255) 35(19.05,1.255) 36(19.05,-1.255) 37(21.59,1.255) 38(21.59,-1.255) 39(24.13,1.255) 40(24.13,-1.255)
Top Overlay:
  lines w0.254: -25.4,-2.555 -25.4,2.525 0,2.525 25.4,2.525 25.4,-2.555 0,-2.555 -25.4,-2.555
  text "1 / 2" at -27.94,-2.105 h1.52
  text "39 / 40" at 26.67,-2.105 h1.52
Top Courtyard:
  lines w0.2: -25.507,2.525 25.4,2.525 25.4,-11.285 -25.63,-11.285 -25.63,2.525 -25.384,2.525
3D body "PBD-4R.step": height 5, standoff -3, extent 20.307,-11.415 25.387,1.585
3D body "PBD-4R.step": height 5, standoff -3, extent 15.227,-11.415 20.307,1.585
3D body "PBD-4R.step": height 5, standoff -3, extent 10.147,-11.415 15.227,1.585
3D body "PBD-4R.step": height 5, standoff -3, extent 5.067,-11.415 10.147,1.585
3D body "PBD-4R.step": height 5, standoff -3, extent -0.013,-11.415 5.067,1.585
3D body "PBD-4R.step": height 5, standoff -3, extent -5.093,-11.415 -0.013,1.585
3D body "PBD-4R.step": height 5, standoff -3, extent -10.173,-11.415 -5.093,1.585
3D body "PBD-4R.step": height 5, standoff -3, extent -15.253,-11.415 -10.173,1.585
3D body "PBD-4R.step": height 5, standoff -3, extent -20.333,-11.415 -15.253,1.585
3D body "PBD-4R.step": height 5, standoff -3, extent -25.413,-11.415 -20.333,1.585

## PBD-40-R-2.54 raspberry Pi Model 3B [mm]
pads (40):
  rect 1.7x1.7 hole 0.9: 1(-24.13,1.255)
  round 1.7 hole 0.9: 2(-24.13,-1.255) 3(-21.59,1.255) 4(-21.59,-1.255) 5(-19.05,1.255) 6(-19.05,-1.255) 7(-16.51,1.255) 8(-16.51,-1.255) 9(-13.97,1.255) 10(-13.97,-1.255) 11(-11.43,1.255) 12(-11.43,-1.255) 13(-8.89,1.255) 14(-8.89,-1.255) 15(-6.35,1.255) 16(-6.35,-1.255) 17(-3.81,1.255) 18(-3.81,-1.255) 19(-1.27,1.255) 20(-1.27,-1.255) 21(1.27,1.255) 22(1.27,-1.255) 23(3.81,1.255) 24(3.81,-1.255) 25(6.35,1.255) 26(6.35,-1.255) 27(8.89,1.255) 28(8.89,-1.255) 29(11.43,1.255) 30(11.43,-1.255) 31(13.97,1.255) 32(13.97,-1.255) 33(16.51,1.255) 34(16.51,-1.255) 35(19.05,1.255) 36(19.05,-1.255) 37(21.59,1.255) 38(21.59,-1.255) 39(24.13,1.255) 40(24.13,-1.255)
Top Overlay:
  lines w0.2: -25.43,-13.685 -25.43,-11.985 25.387,-11.985 25.387,-13.685 ; -25.43,-2.985 -25.413,-2.985 ; -25.413,-2.985 25.37,-2.985 25.37,-11.415 -25.413,-11.415 -25.413,-2.985 ; -32.43,-15.585 54.57,-15.585 54.57,1.255 36.87,1.255 36.87,-13.685 -32.43,-13.685 -32.43,-15.585
  lines w0.254: -25.4,-2.555 0,-2.555 25.4,-2.555 25.4,2.525 0,2.525 -25.4,2.525 -25.4,-2.555
  text "39 / 40" at 26.67,-2.105 h1.52
  text "1 / 2" at -27.94,-2.105 h1.52
Top Assembly:
  lines w0.2: -25.43,-13.685 -25.43,-11.985 25.387,-11.985 25.387,-13.685 ; -25.43,-2.985 -25.413,-2.985 ; -25.413,-2.985 25.37,-2.985 25.37,-11.415 -25.413,-11.415 -25.413,-2.985 ; -32.43,-15.585 54.57,-15.585 54.57,1.255 36.87,1.255 36.87,-13.685 -32.43,-13.685 -32.43,-15.585
  lines w0.254: -25.4,-2.555 0,-2.555 25.4,-2.555 25.4,2.525 0,2.525 -25.4,2.525 -25.4,-2.555
Top Courtyard:
  lines w0.2: -25.4,2.525 -25.43,2.525 ; -25.43,2.525 25.47,2.525 25.47,-13.685 36.634,-13.685 36.634,1.515 54.67,1.515 54.67,-15.585 -32.63,-15.585 -32.63,-13.485 -25.43,-13.485 -25.43,2.525
3D body "raspberryPi3BSimplified_STEP.STEP": height 58.5, standoff 0, extent -32.43,-17.285 54.57,1.265
3D body "PBD-4R.step": height 6, standoff -2, extent -25.413,-11.415 -20.333,1.585
3D body "PBD-4R.step": height 6, standoff -2, extent -15.253,-11.415 -10.173,1.585
3D body "PBD-4R.step": height 6, standoff -2, extent -10.173,-11.415 -5.093,1.585
3D body "PBD-4R.step": height 6, standoff -2, extent -5.093,-11.415 -0.013,1.585
3D body "PBD-4R.step": height 6, standoff -2, extent -0.013,-11.415 5.067,1.585
3D body "PBD-4R.step": height 6, standoff -2, extent 5.067,-11.415 10.147,1.585
3D body "PBD-4R.step": height 6, standoff -2, extent 10.147,-11.415 15.227,1.585
3D body "PBD-4R.step": height 6, standoff -2, extent 15.227,-11.415 20.307,1.585
3D body "PBD-4R.step": height 6, standoff -2, extent 20.307,-11.415 25.387,1.585
3D body "PBD-4R.step": height 6, standoff -2, extent -20.333,-11.415 -15.253,1.585

## PBD-40-R-2.54 raspberry Pi Model 4B [mm]
pads (44):
  round 5 hole 3.2: 0(-29,-21) 0(-29,-8) 0(29,-21) 0(29,-8)
  rect 1.7x1.7 hole 0.9: 1(-24.13,1.27)
  round 1.7 hole 0.9: 2(-24.13,-1.239) 3(-21.59,1.27) 4(-21.59,-1.239) 5(-19.05,1.27) 6(-19.05,-1.239) 7(-16.51,1.27) 8(-16.51,-1.239) 9(-13.97,1.27) 10(-13.97,-1.239) 11(-11.43,1.27) 12(-11.43,-1.239) 13(-8.89,1.27) 14(-8.89,-1.239) 15(-6.35,1.27) 16(-6.35,-1.239) 17(-3.81,1.27) 18(-3.81,-1.239) 19(-1.27,1.27) 20(-1.27,-1.239) 21(1.27,1.27) 22(1.27,-1.239) 23(3.81,1.27) 24(3.81,-1.239) 25(6.35,1.27) 26(6.35,-1.239) 27(8.89,1.27) 28(8.89,-1.239) 29(11.43,1.27) 30(11.43,-1.239) 31(13.97,1.27) 32(13.97,-1.239) 33(16.51,1.27) 34(16.51,-1.239) 35(19.05,1.27) 36(19.05,-1.239) 37(21.59,1.27) 38(21.59,-1.239) 39(24.13,1.27) 40(24.13,-1.239)
Top Overlay:
  lines w0.2: -25.43,-13.67 -25.43,-11.97 25.387,-11.97 25.387,-13.67 ; -25.43,-2.97 -25.413,-2.97 ; -25.413,-2.97 -25.413,-11.399 25.37,-11.399 25.37,-2.97 -25.413,-2.97 ; -32.43,-15.57 -32.43,-13.67 36.87,-13.67 36.87,1.27 54.57,1.27 54.57,-15.57 -32.43,-15.57
  lines w0.254: -25.4,-2.54 -25.4,2.54 0,2.54 25.4,2.54 25.4,-2.54 0,-2.54 -25.4,-2.54
  text "1 / 2" at -27.94,-2.089 h1.52
  text "39 / 40" at 26.67,-2.089 h1.52
Top Assembly:
  lines w0.2: -25.43,-13.67 -25.43,-11.97 25.387,-11.97 25.387,-13.67 ; -25.43,-2.97 -25.413,-2.97 ; -25.413,-2.97 -25.413,-11.399 25.37,-11.399 25.37,-2.97 -25.413,-2.97 ; -32.43,-15.57 -32.43,-13.67 36.87,-13.67 36.87,1.27 54.57,1.27 54.57,-15.57 -32.43,-15.57
  lines w0.254: -25.4,-2.54 -25.4,2.54 0,2.54 25.4,2.54 25.4,-2.54 0,-2.54 -25.4,-2.54
Dimensions:
  lines w0.2: -1.257,0 1.283,0 ; 0,-1.239 0,1.27
Top Courtyard:
  lines w0.2: -25.4,2.54 -25.43,2.54 ; -25.43,2.54 -25.43,-13.47 -32.63,-13.47 -32.63,-15.57 54.67,-15.57 54.67,1.53 36.634,1.53 36.634,-13.67 25.47,-13.67 25.47,2.54 -25.43,2.54
3D body "PBD-4R.step": height 6, standoff -2, extent -20.333,-11.399 -15.253,1.601
3D body "PBD-4R.step": height 6, standoff -2, extent 20.307,-11.399 25.387,1.601
3D body "PBD-4R.step": height 6, standoff -2, extent 15.227,-11.399 20.307,1.601
3D body "PBD-4R.step": height 6, standoff -2, extent 10.147,-11.399 15.227,1.601
3D body "PBD-4R.step": height 6, standoff -2, extent 5.067,-11.399 10.147,1.601
3D body "PBD-4R.step": height 6, standoff -2, extent -0.013,-11.399 5.067,1.601
3D body "PBD-4R.step": height 6, standoff -2, extent -5.093,-11.399 -0.013,1.601
3D body "PBD-4R.step": height 6, standoff -2, extent -10.173,-11.399 -5.093,1.601
3D body "PBD-4R.step": height 6, standoff -2, extent -15.253,-11.399 -10.173,1.601
3D body "PBD-4R.step": height 6, standoff -2, extent -25.413,-11.399 -20.333,1.601
3D body "Raspberry Pi 4 Model B.STEP": height 58.4, standoff 0, extent -32.464,-17.67 56.526,2.23

## PBS-2-2.54 [mil]
pads (2):
  rect 60x60 hole 30: 1(-50,-2)
  round 60 hole 30: 2(50,-2)
Top Overlay:
  lines w10: -100,-52 100,-52 100,48 -100,48 -100,-52
Top Courtyard:
  lines w7.87: -108.27,-59.06 -108.27,59.06 108.27,59.06 108.27,-59.06 -108.27,-59.06
3D body "PBS1-2.54.stp": height 334.65, standoff -124.02, extent -100,-52 0,48
3D body "PBS1-2.54.stp": height 334.65, standoff -124.02, extent 0,-52 100,48

## PBS-3-2.54 [mil]
pads (3):
  rect 60x60 hole 30: 1(-100,0)
  round 60 hole 30: 2(0,0) 3(100,0)
Top Overlay:
  lines w10: -150,-50 150,-50 150,50 -150,50 -150,-50
Top Courtyard:
  lines w7.87: -157.48,-59.06 157.48,-59.06 157.48,59.06 -157.48,59.06 -157.48,-59.06
3D body "PBS1-2.54.stp": height 334.65, standoff -124.02, extent -150,-50 -50,50
3D body "PBS1-2.54.stp": height 334.65, standoff -124.02, extent -50,-50 50,50
3D body "PBS1-2.54.stp": height 334.65, standoff -124.02, extent 50,-50 150,50

## PBS-8-2.54 [mil]
pads (8):
  rect 60x60 hole 30: 1(-348.82,0)
  round 60 hole 30: 2(-248.82,0) 3(-148.82,0) 4(-48.82,0) 5(51.18,0) 6(151.18,0) 7(251.18,0) 8(351.18,0)
Top Overlay:
  lines w10: -3.15,-50 396.85,-50 ; -3.15,50 396.85,50 ; 1.18,-50 -398.82,-50 -398.82,50 1.18,50 ; 401.18,-50 401.18,50
Top Courtyard:
  lines w7.87: -403.54,-59.06 413.39,-59.06 413.39,59.06 -403.54,59.06 -403.54,-59.06
3D body "PBS1-2.54.stp": height 334.65, standoff -124.02, extent -198.82,-50 -98.82,50
3D body "PBS1-2.54.stp": height 334.65, standoff -124.02, extent -98.82,-50 1.18,50
3D body "PBS1-2.54.stp": height 334.65, standoff -124.02, extent 1.18,-50 101.18,50
3D body "PBS1-2.54.stp": height 334.65, standoff -124.02, extent 101.18,-50 201.18,50
3D body "PBS1-2.54.stp": height 334.65, standoff -124.02, extent 201.18,-50 301.18,50
3D body "PBS1-2.54.stp": height 334.65, standoff -124.02, extent 301.18,-50 401.18,50
3D body "PBS1-2.54.stp": height 334.65, standoff -124.02, extent -398.82,-50 -298.82,50
3D body "PBS1-2.54.stp": height 334.65, standoff -124.02, extent -298.82,-50 -198.82,50

## PBS-9-2.54 [mil]
pads (9):
  rect 60x60 hole 30: 1(-348.82,0)
  round 60 hole 30: 2(-248.82,0) 3(-148.82,0) 4(-48.82,0) 5(51.18,0) 6(151.18,0) 7(251.18,0) 8(351.18,0) 9(451,1)
Top Overlay:
  lines w10: -3.15,-50 500,-50 500,50 400,50 -3.15,50 ; 1.18,-50 -398.82,-50 -398.82,50 1.18,50
Top Courtyard:
  lines w7.87: -403.54,-59.06 -403.54,59.06 511.81,59.06 511.81,-59.06 -403.54,-59.06
3D body "PBS1-2.54.stp": height 334.65, standoff -124.02, extent 401,-49 501,51
3D body "PBS1-2.54.stp": height 334.65, standoff -124.02, extent 301.18,-50 401.18,50
3D body "PBS1-2.54.stp": height 334.65, standoff -124.02, extent 201.18,-50 301.18,50
3D body "PBS1-2.54.stp": height 334.65, standoff -124.02, extent 101.18,-50 201.18,50
3D body "PBS1-2.54.stp": height 334.65, standoff -124.02, extent 1.18,-50 101.18,50
3D body "PBS1-2.54.stp": height 334.65, standoff -124.02, extent -98.82,-50 1.18,50
3D body "PBS1-2.54.stp": height 334.65, standoff -124.02, extent -198.82,-50 -98.82,50
3D body "PBS1-2.54.stp": height 334.65, standoff -124.02, extent -298.82,-50 -198.82,50
3D body "PBS1-2.54.stp": height 334.65, standoff -124.02, extent -398.82,-50 -298.82,50

## PBS-10-2.54 [mil]
pads (10):
  rect 60x60 hole 30: 1(-449.41,0)
  round 60 hole 30: 2(-349.41,0) 3(-249.41,0) 4(-149.41,0) 5(-49.41,0) 6(50.59,0) 7(150.59,0) 8(250.59,0) 9(349.41,0) 10(449.41,0)
Top Overlay:
  lines w10: -103.74,-50 499.41,-50 499.41,50 -103.74,50 ; -99.41,-50 -499.41,-50 -499.41,50 -99.41,50
Top Courtyard:
  lines w7.87: -504.92,-59.06 508.86,-59.06 508.86,59.06 -504.92,59.06 -504.92,-59.06
3D body "PBS1-2.54.stp": height 334.65, standoff -124.02, extent -399.41,-50 -299.41,50
3D body "PBS1-2.54.stp": height 334.65, standoff -124.02, extent -499.41,-50 -399.41,50
3D body "PBS1-2.54.stp": height 334.65, standoff -124.02, extent 399.41,-50 499.41,50
3D body "PBS1-2.54.stp": height 334.65, standoff -124.02, extent 299.41,-50 399.41,50
3D body "PBS1-2.54.stp": height 334.65, standoff -124.02, extent 200.59,-50 300.59,50
3D body "PBS1-2.54.stp": height 334.65, standoff -124.02, extent 100.59,-50 200.59,50
3D body "PBS1-2.54.stp": height 334.65, standoff -124.02, extent 0.59,-50 100.59,50
3D body "PBS1-2.54.stp": height 334.65, standoff -124.02, extent -99.41,-50 0.59,50
3D body "PBS1-2.54.stp": height 334.65, standoff -124.02, extent -199.41,-50 -99.41,50
3D body "PBS1-2.54.stp": height 334.65, standoff -124.02, extent -299.41,-50 -199.41,50